# Altium footprint library Miscellaneous Header.PcbLib: 168 footprints (part 9 of 11)
Each footprint in its own frame and in the unit in brackets; x right, y up, seen from the top. Pads: shape width x height; smd on the part's side, far side on the other; paste and mask are expansions set on the pad; w line width, h text height; cw(c..) or ccw(c..) is an arc to the next point about the centre after c.
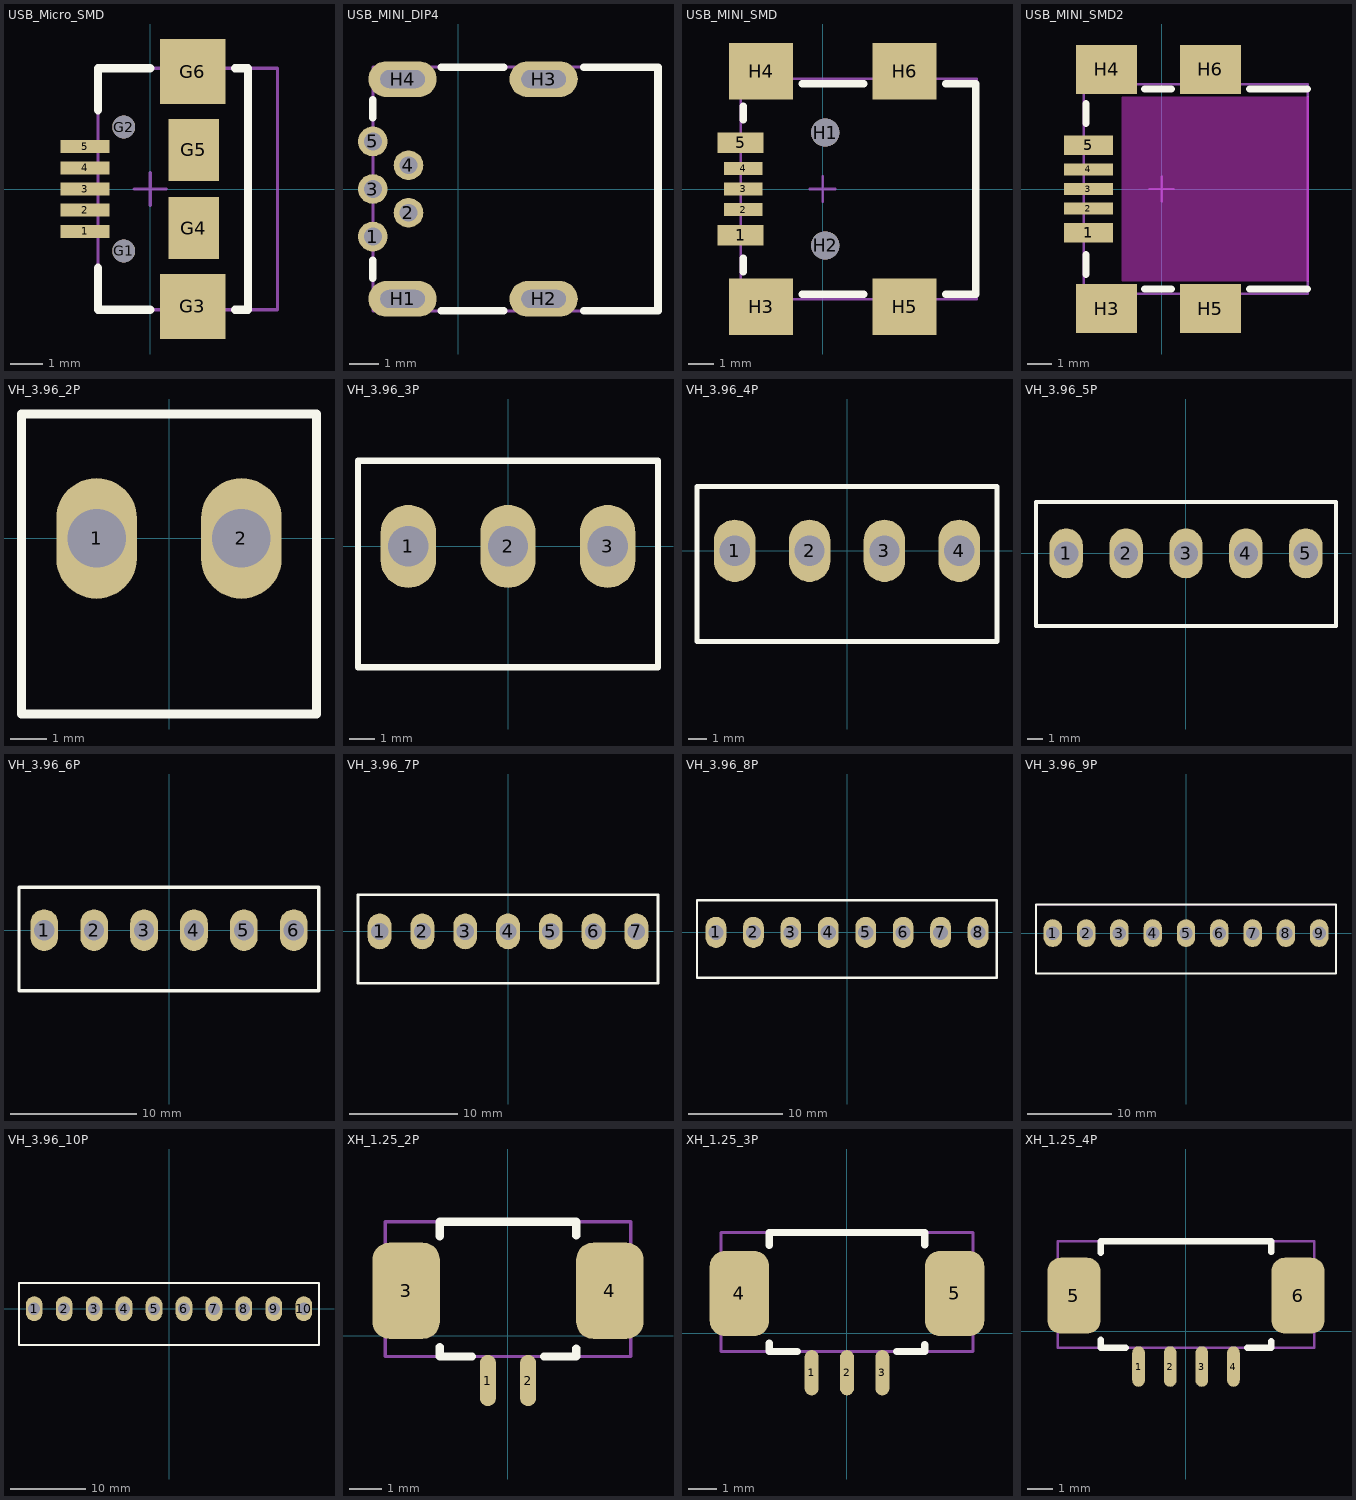
[diagram p8: the footprints below, top view; thin cyan lines are the x and y axes]

## USB_Micro_SMD [mm]
pads (11):
  rect 1.5x0.4 smd: 1(-2,-1.3) 2(-2,-0.65) 3(-2,0) 4(-2,0.65) 5(-2,1.3)
  round 0.7 hole 0.7 unplated: G1(-0.813,-1.9) G2(-0.813,1.9)
  rect 2x2 smd: G3(1.3,-3.6) G6(1.3,3.6)
  rect 1.55x1.9 smd: G4(1.338,-1.2) G5(1.338,1.2)
Top Overlay:
  lines w0.254: -1.6,-2.413 -1.6,-3.7 0,-3.7 ; -1.6,2.413 -1.6,3.7 0,3.7 ; 2.6,-3.7 3,-3.7 3,3.7 2.6,3.7
Mechanical 15:
  lines w0.1: -0.5,0 0.5,0 ; 0,-0.5 0,0.5 ; 3,-3.7 3,3.7 ; -1.6,-3.7 3.9,-3.7 3.9,3.7 -1.6,3.7 -1.6,-3.7
3D body: height 2.72, standoff -0.22, extent -1.53,-3.99 3.9,3.99

## USB_MINI_DIP4 [mm]
pads (9):
  round 1 hole 0.6: 1(-2.875,-1.6) 2(-1.675,-0.8) 3(-2.875,0) 4(-1.675,0.8) 5(-2.875,1.6)
  oval 2.3x1.2 hole 0.6 slot 1.5 at 0 deg: H1(-1.875,-3.7) H2(2.875,-3.7) H3(2.875,3.7) H4(-1.875,3.7)
Top Overlay:
  lines w0.254: -2.875,-3 -2.875,-2.4 ; -2.875,2.4 -2.875,3 ; -0.575,-4.1 1.525,-4.1 ; -0.575,4.1 1.525,4.1 ; 4.225,-4.1 6.725,-4.1 6.725,4.1 4.225,4.1
Mechanical 15:
  lines w0.1: -2.875,-4.1 6.725,-4.1 6.725,4.1 -2.875,4.1 -2.875,-4.1
3D body: height 3.95, standoff -1.8, extent -3.075,-3.85 5.925,3.85

## USB_MINI_SMD [mm]
pads (11):
  rect 1.8x0.8 smd: 1(-3.2,-1.8) 5(-3.2,1.8)
  rect 1.5x0.5 smd: 2(-3.1,-0.8) 3(-3.1,0) 4(-3.1,0.8)
  round 1.1 hole 1.1 unplated: H1(0.1,2.2) H2(0.1,-2.2)
  rect 2.5x2.2 smd: H3(-2.4,-4.6) H4(-2.4,4.6) H5(3.2,-4.6) H6(3.2,4.6)
Top Overlay:
  lines w0.3: -3.1,-2.7 -3.099,-3.226 ; -3.1,2.7 -3.099,3.226 ; -0.8,-4.1 1.6,-4.1 ; -0.8,4.1 1.6,4.1 ; 4.8,-4.1 5.969,-4.1 5.969,4.1 4.8,4.1
Mechanical 15:
  lines w0.1: -0.5,0 0.5,0 ; 0,-0.5 0,0.5 ; -3.2,-4.3 6,-4.3 6,4.3 -3.2,4.3 -3.2,-4.3
3D body: height 3.95, standoff -1, extent -3.2,-5.35 6,5.35

## USB_MINI_SMD2 [mm]
pads (9):
  rect 2x0.8 smd: 1(-3,-1.8) 5(-3,1.8)
  rect 2x0.5 smd: 2(-3,-0.8) 3(-3,0) 4(-3,0.8)
  rect 2.5x2 smd: H3(-2.25,-4.9) H4(-2.25,4.9) H5(2,-4.9) H6(2,4.9)
Top Overlay:
  lines w0.3: -3.1,-3.5 -3.1,-2.7 ; -3.1,2.7 -3.1,3.5 ; -0.7,-4.1 0.4,-4.1 ; -0.7,4.1 0.4,4.1 ; 3.6,-4.1 5.969,-4.1 ; 3.6,4.1 5.969,4.1
Keep-Out Layer:
  board cut-out: 6,3.75 -1.6,3.75 -1.6,-3.75 6,-3.75
  lines w0.1: -1.6,-3.75 6,-3.75 6,3.75 -1.6,3.75 -1.6,-3.75
Mechanical 15:
  lines w0.1: -0.5,0 0.5,0 ; 0,-0.5 0,0.5 ; -3.2,-4.3 6,-4.3 6,4.3 -3.2,4.3 -3.2,-4.3

## VH_3.96_2P [mm]
pads (2):
  oval 2.2x3.3 hole 1.6: 1(-1.98,0) 2(1.98,0)
Top Overlay:
  lines w0.254: -4.03,-4.8 4.03,-4.8 4.03,3.4 -4.03,3.4 -4.03,-4.8
Mechanical 15:
  lines w0.1: -4.03,-4.8 4.03,-4.8 4.03,3.4 -4.03,3.4 -4.03,-4.8
3D body: height 10.9, standoff -3.7, extent -3.905,-4.6 3.955,3.9

## VH_3.96_3P [mm]
pads (3):
  oval 2.2x3.3 hole 1.6: 1(-3.96,0) 2(0,0) 3(3.96,0)
Top Overlay:
  lines w0.254: -5.96,-4.8 -5.96,3.4 5.96,3.4 5.96,-4.8 -5.96,-4.8
Mechanical 15:
  lines w0.1: -5.96,-4.8 -5.96,3.4 5.96,3.4 5.96,-4.8 -5.96,-4.8
3D body: height 10.9, standoff -3.7, extent -5.885,-4.6 5.935,3.9

## VH_3.96_4P [mm]
pads (4):
  oval 2.2x3.3 hole 1.6: 1(-5.94,0) 2(-1.98,0) 3(1.98,0) 4(5.94,0)
Top Overlay:
  lines w0.254: -7.94,-4.8 7.94,-4.8 7.94,3.4 -7.94,3.4 -7.94,-4.8
Mechanical 15:
  lines w0.1: -7.94,-4.8 -7.94,3.4 7.94,3.4 7.94,-4.8 -7.94,-4.8
3D body: height 10.9, standoff -3.7, extent -7.865,-4.6 7.915,3.9

## VH_3.96_5P [mm]
pads (5):
  oval 2.2x3.3 hole 1.6: 1(-7.92,0) 2(-3.96,0) 3(0,0) 4(3.96,0) 5(7.92,0)
Top Overlay:
  lines w0.254: -9.92,-4.8 9.92,-4.8 9.92,3.4 -9.92,3.4 -9.92,-4.8
Mechanical 15:
  lines w0.1: -9.92,-4.8 -9.92,3.4 9.92,3.4 9.92,-4.8 -9.92,-4.8
3D body: height 10.9, standoff -3.7, extent -9.845,-4.6 9.895,3.9

## VH_3.96_6P [mm]
pads (6):
  oval 2.2x3.3 hole 1.6: 1(-9.9,0) 2(-5.94,0) 3(-1.98,0) 4(1.98,0) 5(5.94,0) 6(9.9,0)
Top Overlay:
  lines w0.254: -11.9,-4.8 -11.9,3.4 11.88,3.4 11.88,-4.8 -11.9,-4.8
Mechanical 15:
  lines w0.1: -11.9,-4.8 11.9,-4.8 11.9,3.4 -11.9,3.4 -11.9,-4.8
3D body: height 10.9, standoff -3.7, extent -0.005,-4.6 11.815,3.9
3D body: height 10.9, standoff -3.7, extent -11.825,-4.6 -0.005,3.9

## VH_3.96_7P [mm]
pads (7):
  oval 2.2x3.3 hole 1.6: 1(-11.88,0) 2(-7.92,0) 3(-3.96,0) 4(0,0) 5(3.96,0) 6(7.92,0) 7(11.88,0)
Top Overlay:
  lines w0.254: -13.88,-4.8 -13.88,3.4 13.88,3.4 13.88,-4.8 -13.88,-4.8
Mechanical 15:
  lines w0.1: -13.88,-4.8 13.88,-4.8 13.88,3.4 -13.88,3.4 -13.88,-4.8
3D body: height 10.9, standoff -3.7, extent -13.855,-4.8 13.805,3.7

## VH_3.96_8P [mm]
pads (8):
  oval 2.2x3.3 hole 1.6: 1(-13.86,0) 2(-9.9,0) 3(-5.94,0) 4(-1.98,0) 5(1.98,0) 6(5.94,0) 7(9.9,0) 8(13.86,0)
Top Overlay:
  lines w0.254: -15.86,-4.8 -15.86,3.4 15.84,3.4 15.84,-4.8 -15.86,-4.8
Mechanical 15:
  lines w0.1: 15.84,3.4 -15.86,3.4 -15.86,-4.8 15.86,-4.8 15.86,3.4
3D body: height 10.9, standoff -3.7, extent -15.785,-4.6 15.835,3.9

## VH_3.96_9P [mm]
pads (9):
  oval 2.2x3.3 hole 1.6: 1(-15.84,0) 2(-11.88,0) 3(-7.92,0) 4(-3.96,0) 5(0,0) 6(3.96,0) 7(7.92,0) 8(11.88,0) 9(15.84,0)
Top Overlay:
  lines w0.254: -17.84,-4.8 -17.84,3.4 17.84,3.4 17.84,-4.8 -17.84,-4.8
Mechanical 15:
  lines w0.1: -17.84,-4.8 17.84,-4.8 17.84,3.4 -17.84,3.4 -17.84,-4.8
3D body: height 10.9, standoff -3.7, extent -17.765,-4.6 17.815,3.9

## VH_3.96_10P [mm]
pads (10):
  oval 2.2x3.3 hole 1.6: 1(-17.82,0) 2(-13.86,0) 3(-9.9,0) 4(-5.94,0) 5(-1.98,0) 6(1.98,0) 7(5.94,0) 8(9.9,0) 9(13.86,0) 10(17.82,0)
Top Overlay:
  lines w0.254: -19.82,-4.8 19.8,-4.8 19.8,3.4 -19.82,3.4 -19.82,-4.8
Mechanical 15:
  lines w0.1: -19.82,-4.8 -19.82,3.4 19.82,3.4 19.82,-4.8 -19.82,-4.8
3D body: height 10.9, standoff -3.7, extent -19.745,-4.6 19.795,3.9

## XH_1.25_2P [mm]
pads (4):
  oval 0.5x1.6 smd: 1(-0.625,-1.4) 2(0.625,-1.4)
  rrect50% 2.1x3 smd: 3(-3.175,1.4) 4(3.175,1.4)
Top Overlay:
  lines w0.254: -2.125,-0.35 -2.125,-0.65 -1.125,-0.65 ; -2.125,3.1 -2.125,3.55 2.125,3.55 2.125,3.125 ; 1.125,-0.65 2.125,-0.65 2.125,-0.4
Mechanical 15:
  lines w0.1: -3.825,-0.65 -3.825,3.55 3.825,3.55 3.825,-0.65 -3.825,-0.65

## XH_1.25_3P [mm]
pads (5):
  oval 0.5x1.6 smd: 1(-1.25,-1.4) 2(0,-1.4) 3(1.25,-1.4)
  rrect50% 2.1x3 smd: 4(-3.8,1.4) 5(3.8,1.4)
Top Overlay:
  lines w0.254: -2.75,-0.35 -2.75,-0.65 -1.75,-0.65 ; -2.75,3.1 -2.75,3.55 2.75,3.55 2.75,3.125 ; 1.75,-0.65 2.75,-0.65 2.75,-0.4
Mechanical 15:
  lines w0.1: -4.45,-0.65 4.45,-0.65 4.45,3.55 -4.45,3.55 -4.45,-0.65

## XH_1.25_4P [mm]
pads (6):
  oval 0.5x1.6 smd: 1(-1.875,-1.4) 2(-0.625,-1.4) 3(0.625,-1.4) 4(1.875,-1.4)
  rrect50% 2.1x3 smd: 5(-4.425,1.4) 6(4.425,1.4)
Top Overlay:
  lines w0.254: -3.375,-0.35 -3.375,-0.65 -2.375,-0.65 ; -3.375,3.1 -3.375,3.55 3.375,3.55 3.375,3.125 ; 2.425,-0.65 3.375,-0.65 3.375,-0.4
Mechanical 15:
  lines w0.1: -5.075,-0.65 -5.075,3.55 5.075,3.55 5.075,-0.65 -5.075,-0.65
3D body: height 3.5, standoff 0, extent -5.075,-1.65 5.075,3.55